# Altium footprint library Opencore_PCB_Lib.PcbLib: 39 footprints (part 2 of 3)
Each footprint in its own frame and in the unit in brackets; x right, y up, seen from the top. Pads: shape width x height; smd on the part's side, far side on the other; paste and mask are expansions set on the pad; w line width, h text height; cw(c..) or ccw(c..) is an arc to the next point about the centre after c.
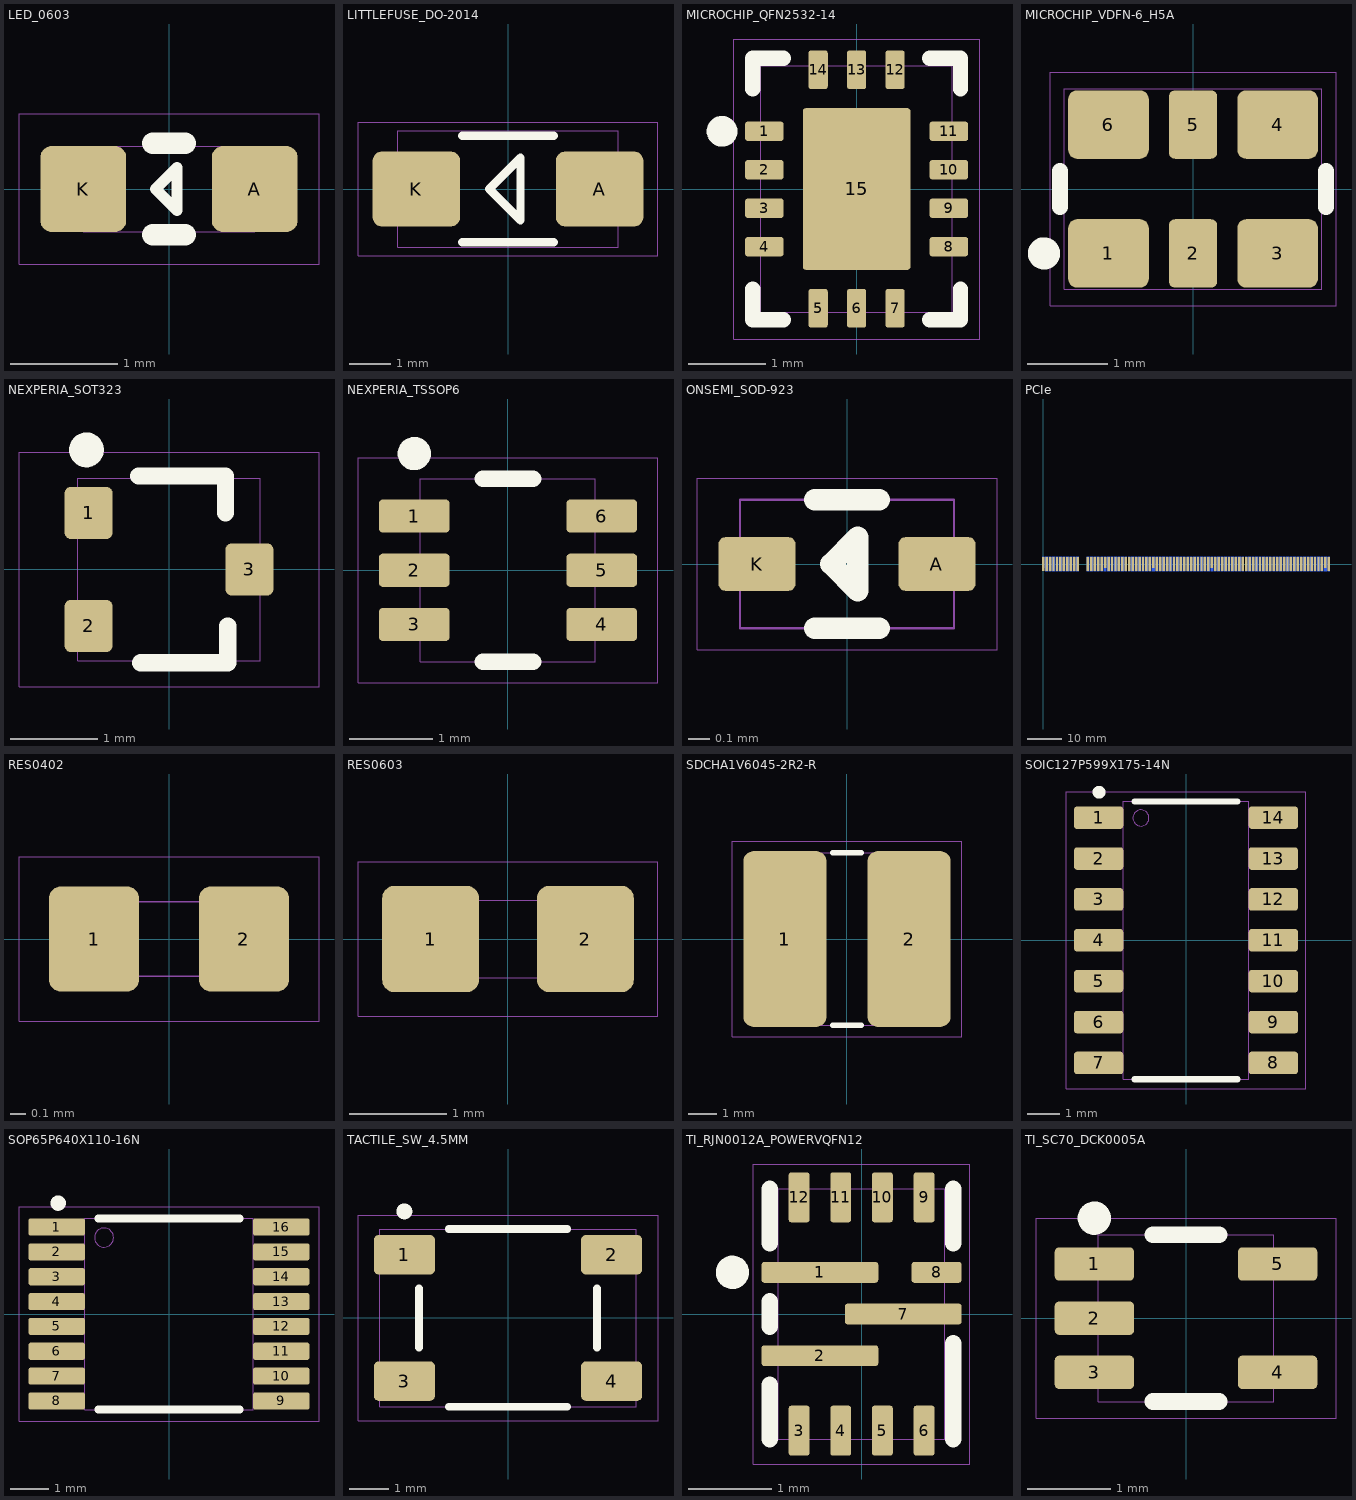
[diagram p1: the footprints below, top view; thin cyan lines are the x and y axes]

## LED_0603 [mm]
pads (2):
  rrect25% 0.8x0.8 smd: A(0.8,0) K(-0.8,0)
Top Overlay:
  lines w0.1: -0.125,0 0.075,-0.2 0.075,0.2 -0.125,0
  lines w0.2: -0.15,-0.425 0.15,-0.425 ; -0.15,0.425 0.15,0.425
Top Component Outline:
  lines w0.01: -0.8,-0.4 -0.8,0.4 0.8,0.4 0.8,-0.4 -0.8,-0.4 ; -0.125,0 0.075,-0.2 0.075,0.2 -0.125,0
Top Designator (Mech11):
  text ".Designator" at -1.823,-0.179 h0.5
Top Courtyard:
  lines w0.001: -1.4,-0.7 1.4,-0.7 1.4,0.7 -1.4,0.7 -1.4,-0.7
3D body "Wurth_150060xS75000_rev1.stp": height 0.7, standoff 0, extent -0.8,-0.4 0.8,0.4

## LITTLEFUSE_DO-2014 [mm]
pads (2):
  rrect25% 2.1x1.8 smd: A(2.2,0) K(-2.2,0)
Top Overlay:
  lines w0.2: -1.1,-1.275 1.1,-1.275 ; -1.1,1.275 1.1,1.275 ; -0.45,0 0.3,0.75 0.3,-0.75 -0.45,0 ; -0.45,0 -0.45,0
Top Component Outline:
  lines w0.01: -0.45,0 0.3,-0.75 0.3,0.75 -0.45,0 ; -0.45,0 -0.45,0 ; -2.642,-1.4 -2.642,1.4 2.643,1.4 2.643,-1.4 -2.642,-1.4
Top Designator (Mech11):
  text ".Designator" at -3.647,-0.357 h1
Top Courtyard:
  lines w0.001: -3.6,-1.6 3.6,-1.6 3.6,1.6 -3.6,1.6 -3.6,-1.6
3D body "SMASeries_LTF.step": height 2.34, standoff 0, extent -2.642,-1.397 2.642,1.397

## MICROCHIP_QFN2532-14 [mm]
height 0.85
pads (15):
  rrect25% 0.5x0.25 smd mask+0.05: 1(-1.2,0.75) 2(-1.2,0.25) 3(-1.2,-0.25) 4(-1.2,-0.75) 8(1.2,-0.75) 9(1.2,-0.25) 10(1.2,0.25) 11(1.2,0.75)
  rrect25% 0.25x0.5 smd mask+0.05: 5(-0.5,-1.55) 6(0,-1.55) 7(0.5,-1.55) 12(0.5,1.55) 13(0,1.55) 14(-0.5,1.55)
  rrect5% 1.4x2.1 smd mask+0.05: 15(0,0)
Top Overlay:
  circle w0.2: c-1.75,0.75 r0.1
  lines w0.2: -1.35,-1.3 -1.35,-1.7 -0.95,-1.7 ; -1.35,1.3 -1.35,1.7 -0.95,1.7 ; 0.95,-1.7 1.35,-1.7 1.35,-1.3 ; 0.95,1.7 1.35,1.7 1.35,1.3
Top Component Outline:
  lines w0.01: -1.246,-1.6 1.244,-1.6 1.244,1.6 -1.246,1.6 -1.246,-1.6
Top Designator (Mech11):
  text ".Designator" at 0.179,-1.823 h0.5
Top Courtyard:
  lines w0.01: -1.6,-1.95 1.6,-1.95 1.6,1.95 -1.6,1.95 -1.6,-1.95
3D body "VQFN14_MUA_1p4x2p1EP_MCH.step": height 0.89, standoff 0, extent -1.245,-1.6 1.245,1.6

## MICROCHIP_VDFN-6_H5A [mm]
pads (6):
  rrect25% 1x0.85 smd mask+0.05: 1(-1.05,-0.8) 3(1.05,-0.8) 4(1.05,0.8) 6(-1.05,0.8)
  rrect25% 0.6x0.85 smd mask+0.05: 2(0,-0.8) 5(0,0.8)
Top Overlay:
  circle w0.2: c-1.85,-0.8 r0.1
  lines w0.2: -1.65,-0.225 -1.65,0.225 ; 1.65,-0.225 1.65,0.225
Top Component Outline:
  lines w0.01: -1.6,-1.246 -1.6,1.245 1.6,1.245 1.6,-1.246 -1.6,-1.246
Top Designator (Mech11):
  text ".Designator" at -1.823,-0.179 h0.5
Top Courtyard:
  lines w0.001: -1.775,-1.45 1.775,-1.45 1.775,1.45 -1.775,1.45 -1.775,-1.45
3D body "VDFN6_3P2X2P5_MCH.step": height 0.84, standoff 0, extent -1.6,-1.245 1.6,1.245

## NEXPERIA_SOT323 [mm] "SOT323, 3-Leads, Body 2.00x2.10mm, Pitch 0.65mm, IPC Medium Density"
height 1.1
pads (3):
  rrect25% 0.55x0.6 smd: 1(-0.925,0.65) 2(-0.925,-0.65) 3(0.925,0)
Top Overlay:
  circle w0.2: c-0.95,1.375 r0.1
  lines w0.2: -0.35,1.075 0.65,1.075 0.65,0.65 ; -0.325,-1.075 0.675,-1.075 0.675,-0.65
Top Component Outline:
  lines w0.01: -1.05,-1.05 1.05,-1.05 1.05,1.05 -1.05,1.05 -1.05,-1.05
Top Designator (Mech11):
  text ".Designator" at -2.735,-0.268 h0.75
Top Courtyard:
  lines w0.001: -1.725,-1.35 1.725,-1.35 1.725,1.35 -1.725,1.35 -1.725,-1.35
3D body "SOT323.step": height 0.96, standoff 0.01, extent -1.05,-1.05 1.05,1.05

## NEXPERIA_TSSOP6 [mm] "TSOP, 6-Leads, Body 2.00x1.25mm, Pitch 0.65mm, IPC Medium Density"
height 1.1
pads (6):
  rrect25% 0.85x0.4 smd mask+0.05: 1(-1.125,0.65) 2(-1.125,0) 3(-1.125,-0.65) 4(1.125,-0.65) 5(1.125,0) 6(1.125,0.65)
Top Overlay:
  circle w0.2: c-1.125,1.4 r0.1
  lines w0.2: -0.3,-1.1 0.3,-1.1 ; -0.3,1.1 0.3,1.1
Top Component Outline:
  lines w0.01: -1.05,-1.1 -1.05,1.1 1.05,1.1 1.05,-1.1 -1.05,-1.1
Top Courtyard:
  lines w0.001: -1.8,-1.35 -1.8,1.35 1.8,1.35 1.8,-1.35 -1.8,-1.35
3D body "TSOP65P210X110-6N.step": height 1.1, standoff 0, extent -1.05,-1.1 1.05,1.1

## ONSEMI_SOD-923 [mm]
height 0.37
pads (2):
  rrect25% 0.36x0.25 smd mask+0.05: A(0.42,0) K(-0.42,0)
Top Overlay:
  lines w0.1: -0.15,-0.3 0.15,-0.3 ; -0.15,0.3 0.15,0.3 ; 0.05,0.125 -0.075,0 0.05,-0.125 0.05,0.125 ; 0.05,0.125 0.05,0.125
Top Component Outline:
  lines w0.01: 0.075,-0.15 0.075,0.15 ; 0.075,-0.15 0.075,-0.15 ; 0.075,-0.15 0.075,-0.15 ; 0.075,-0.15 0.075,-0.15 ; 0.075,-0.15 -0.075,0 0.075,0.15 ; 0.075,0.15 0.075,0.15 ; -0.5,-0.3 -0.5,0.3 0.5,0.3 0.5,-0.3 -0.5,-0.3
Top Designator (Mech11):
  text ".Designator" at -0.912,-0.089 h0.25
Top Courtyard:
  lines w0.001: -0.7,-0.4 0.7,-0.4 0.7,0.4 -0.7,0.4 -0.7,-0.4
3D body "ESD9B5.0ST5G.step": height 0.41, standoff 0.01, extent -0.5,-0.3 0.5,0.3

## PCIe [mm]
pads (164):
  rect 0.7x3.2 smd far side: A1(0,0.5)
  rect 0.7x4.2 smd far side: A2(1,0) A3(2,0) A4(3,0) A5(4,0) A6(5,0) A7(6,0) A8(7,0) A9(8,0) A10(9,0) A11(10,0) A12(13,0) A13(14,0) A14(15,0) A15(16,0) A16(17,0) A17(18,0) A18(19,0) A19(20,0) A20(21,0) A21(22,0) A22(23,0) A23(24,0) A24(25,0) A25(26,0) A26(27,0) A27(28,0) A28(29,0) A29(30,0) A30(31,0) A31(32,0) A32(33,0) A33(34,0) A34(35,0) A35(36,0) A36(37,0) A37(38,0) A38(39,0) A39(40,0) A40(41,0) A41(42,0) A42(43,0) A43(44,0) A44(45,0) A45(46,0) A46(47,0) A47(48,0) A48(49,0) A49(50,0) A50(51,0) A51(52,0) A52(53,0) A53(54,0) A54(55,0) A55(56,0) A56(57,0) A57(58,0) A58(59,0) A59(60,0) A60(61,0) A61(62,0) A62(63,0) A63(64,0) A64(65,0) A65(66,0) A66(67,0) A67(68,0) A68(69,0) A69(70,0) A70(71,0) A71(72,0) A72(73,0) A73(74,0) A74(75,0) A75(76,0) A76(77,0) A77(78,0) A78(79,0) A79(80,0) A80(81,0) A81(82,0) A82(83,0)
  rect 0.7x4.2 smd: B1(0,0) B2(1,0) B3(2,0) B4(3,0) B5(4,0) B6(5,0) B7(6,0) B8(7,0) B9(8,0) B10(9,0) B11(10,0) B12(13,0) B13(14,0) B14(15,0) B15(16,0) B16(17,0) B18(19,0) B19(20,0) B20(21,0) B21(22,0) B22(23,0) B23(24,0) B24(25,0) B25(26,0) B26(27,0) B27(28,0) B28(29,0) B29(30,0) B30(31,0) B32(33,0) B33(34,0) B34(35,0) B35(36,0) B36(37,0) B37(38,0) B38(39,0) B39(40,0) B40(41,0) B41(42,0) B42(43,0) B43(44,0) B44(45,0) B45(46,0) B46(47,0) B47(48,0) B49(50,0) B50(51,0) B51(52,0) B52(53,0) B53(54,0) B54(55,0) B55(56,0) B56(57,0) B57(58,0) B58(59,0) B59(60,0) B60(61,0) B61(62,0) B62(63,0) B63(64,0) B64(65,0) B65(66,0) B66(67,0) B67(68,0) B68(69,0) B69(70,0) B70(71,0) B71(72,0) B72(73,0) B73(74,0) B74(75,0) B75(76,0) B76(77,0) B77(78,0) B78(79,0) B79(80,0) B80(81,0) B82(83,0)
  rect 0.7x3.2 smd: B17(18,0.5) B31(32,0.5) B48(49,0.5) B81(82,0.5)

## RES0402 [mm] "Chip Resistor, Body 1x0.5mm, IPC Medium Density"
pads (2):
  rrect25% 0.6x0.7 smd: 1(-0.5,0) 2(0.5,0)
Top Component Outline:
  lines w0.01: -0.5,-0.25 -0.5,0.25 0.5,0.25 0.5,-0.25 -0.5,-0.25
Top Designator (Mech11):
  text ".Designator" at -0.912,-0.089 h0.25
Top Courtyard:
  lines w0.001: -1,-0.55 -1,0.55 1,0.55 1,-0.55 -1,-0.55
3D body "User Library-R SMD 0402.STEP": height 0.27, standoff -0.08, extent -0.5,-0.25 0.5,0.25

## RES0603 [mm] "Chip Resistor, Body 1.6x0.8mm, IPC Medium Density"
height 0.6
pads (2):
  rrect25% 1x1.1 smd: 1(-0.8,0) 2(0.8,0)
Top Component Outline:
  lines w0.01: -0.8,-0.4 0.8,-0.4 0.8,0.4 -0.8,0.4 -0.8,-0.4
Top Designator (Mech11):
  text ".Designator" at -1.823,-0.179 h0.5
Top Courtyard:
  lines w0.001: -1.55,-0.8 -1.55,0.8 1.55,0.8 1.55,-0.8 -1.55,-0.8
3D body "0603.step": height 0.46, standoff 0.01, extent -0.8,-0.4 0.8,0.4

## SDCHA1V6045-2R2-R [mm] "Eaton 6mm x 6mm"
pads (2):
  rrect25% 2.9x6.12 smd: 1(-2.16,0) 2(2.16,0)
Top Overlay:
  lines w0.2: -0.5,-3 0.5,-3 ; -0.5,3 0.5,3
Top Component Outline:
  lines w0.01: -3,-3 3,-3 3,3 -3,3 -3,-3
Top Designator (Mech11):
  text ".Designator" at -3.647,-0.357 h1
Top Courtyard:
  lines w0.001: -4,-3.4 4,-3.4 4,3.4 -4,3.4 -4,-3.4
3D body "SDCHA1V6045.stp": height 4.37, standoff 0.01, extent -3,-3 3,3

## SOIC127P599X175-14N [mm]
pads (14):
  rrect25% 1.526x0.7 smd: 1(-2.712,3.81) 2(-2.712,2.54) 3(-2.712,1.27) 4(-2.712,0) 5(-2.712,-1.27) 6(-2.712,-2.54) 7(-2.712,-3.81) 8(2.712,-3.81) 9(2.712,-2.54) 10(2.712,-1.27) 11(2.712,0) 12(2.712,1.27) 13(2.712,2.54) 14(2.712,3.81)
Top Overlay:
  circle w0.2: c-2.7,4.6 r0.1
  lines w0.2: -1.6,-4.312 1.6,-4.312 ; -1.6,4.312 1.6,4.312
Top Component Outline:
  circle w0.01: c-1.4,3.8 r0.25
  lines w0.01: -1.95,-4.312 -1.95,4.312 1.95,4.312 1.95,-4.312 -1.95,-4.312
Top Designator (Mech11):
  text ".Designator" at 0.357,-3.647 h1
Top Courtyard:
  lines w0.001: -3.725,-4.619 3.725,-4.619 3.725,4.619 -3.725,4.619 -3.725,-4.619
3D body "DS90LV019TM.stp": height 1.75, standoff 0, extent -2.997,-4.312 2.997,4.312

## SOP65P640X110-16N [mm]
pads (16):
  rrect25% 1.475x0.45 smd mask+0.05: 1(-2.938,2.275) 2(-2.938,1.625) 3(-2.938,0.975) 4(-2.938,0.325) 5(-2.938,-0.325) 6(-2.938,-0.975) 7(-2.938,-1.625) 8(-2.938,-2.275) 9(2.938,-2.275) 10(2.938,-1.625) 11(2.938,-0.975) 12(2.938,-0.325) 13(2.938,0.325) 14(2.938,0.975) 15(2.938,1.625) 16(2.938,2.275)
Top Overlay:
  circle w0.2: c-2.9,2.9 r0.1
  lines w0.2: -1.85,-2.5 1.85,-2.5 ; -1.85,2.5 1.85,2.5
Top Component Outline:
  circle w0.01: c-1.7,2 r0.25
  lines w0.01: -2.2,-2.5 -2.2,2.5 2.2,2.5 2.2,-2.5 -2.2,-2.5
Top Designator (Mech11):
  text ".Designator" at -3.647,-0.357 h1
Top Courtyard:
  lines w0.001: -3.925,-2.8 -3.925,2.8 3.925,2.8 3.925,-2.8 -3.925,-2.8
3D body "74AVC4T245PW,118.stp": height 0.98, standoff 0, extent -3.21,-2.52 3.21,2.48

## TACTILE_SW_4.5MM [mm] "CKS Tactile Switch - 4.5mm x 4.5mm"
height 5
pads (4):
  rrect25% 1.55x1 smd: 1(-2.625,1.6) 2(2.625,1.6) 3(-2.625,-1.6) 4(2.625,-1.6)
Top Overlay:
  circle w0.2: c-2.625,2.7 r0.1
  lines w0.2: -2.25,-0.75 -2.25,0.75 ; -1.5,-2.25 1.5,-2.25 ; -1.5,2.25 1.5,2.25 ; 2.25,-0.75 2.25,0.75
Top Component Outline:
  circle w0.01: c-2.5,1.6 r0.25
  lines w0.01: -3.25,-2.25 -3.25,2.25 3.25,2.25 3.25,-2.25 -3.25,-2.25
Top Designator (Mech11):
  text ".Designator" at -3.647,-0.357 h1
Top Courtyard:
  lines w0.001: -3.8,-2.6 3.8,-2.6 3.8,2.6 -3.8,2.6 -3.8,-2.6
3D body "PTS647SN50SMTR2LFS.stp": height 5.01, standoff 0.01, extent -3.25,-2.252 3.25,2.25

## TI_RJN0012A_POWERVQFN12 [mm] "12 VQFN-HR"
pads (12):
  rrect25% 1.4x0.25 smd mask+0.05: 1(-0.5,0.5) 2(-0.5,-0.5) 7(0.5,0)
  rrect25% 0.25x0.6 smd mask+0.05: 3(-0.75,-1.4) 4(-0.25,-1.4) 5(0.25,-1.4) 6(0.75,-1.4) 9(0.75,1.4) 10(0.25,1.4) 11(-0.25,1.4) 12(-0.75,1.4)
  rrect25% 0.6x0.25 smd mask+0.05: 8(0.9,0.5)
Top Overlay:
  circle w0.2: c-1.55,0.5 r0.1
  lines w0.2: -1.1,-1.5 -1.1,-0.85 ; -1.1,-0.15 -1.1,0.15 ; -1.1,0.85 -1.1,1.5 ; 1.1,-1.5 1.1,-0.35 ; 1.1,0.85 1.1,1.5
Top Component Outline:
  lines w0.01: -1,-1.5 -1,1.5 1,1.5 1,-1.5 -1,-1.5
Top Designator (Mech11):
  text ".Designator" at 0.179,-1.823 h0.5
Top Courtyard:
  lines w0.001: -1.3,-1.8 -1.3,1.8 1.3,1.8 1.3,-1.8 -1.3,-1.8
3D body "TPS51385RJNR.step": height 1.01, standoff 0.01, extent -1,-1.5 1,1.5

## TI_SC70_DCK0005A [mm]
pads (5):
  rrect25% 0.95x0.4 smd mask+0.05: 1(-1.1,0.65) 2(-1.1,0) 3(-1.1,-0.65) 4(1.1,-0.65) 5(1.1,0.65)
Top Overlay:
  circle w0.2: c-1.1,1.2 r0.1
  lines w0.2: -0.4,-1 0.4,-1 ; -0.4,1 0.4,1
Top Component Outline:
  lines w0.01: -1.05,-1 -1.05,1 1.05,1 1.05,-0.225 1.05,-1 -0.8,-1 -1.05,-1
Top Designator (Mech11):
  text ".Designator" at -1.823,-0.179 h0.5
Top Courtyard:
  lines w0.001: -1.8,-1.2 1.8,-1.2 1.8,1.2 -1.8,1.2 -1.8,-1.2
3D body "DCK0005A.stp": height 1, standoff 0, extent -1.05,-1 1.05,1